# Altium footprint library fszhang.PcbLib: 1032 footprints (part 51 of 66)
Each footprint in its own frame and in the unit in brackets; x right, y up, seen from the top. Pads: shape width x height; smd on the part's side, far side on the other; paste and mask are expansions set on the pad; w line width, h text height; cw(c..) or ccw(c..) is an arc to the next point about the centre after c.
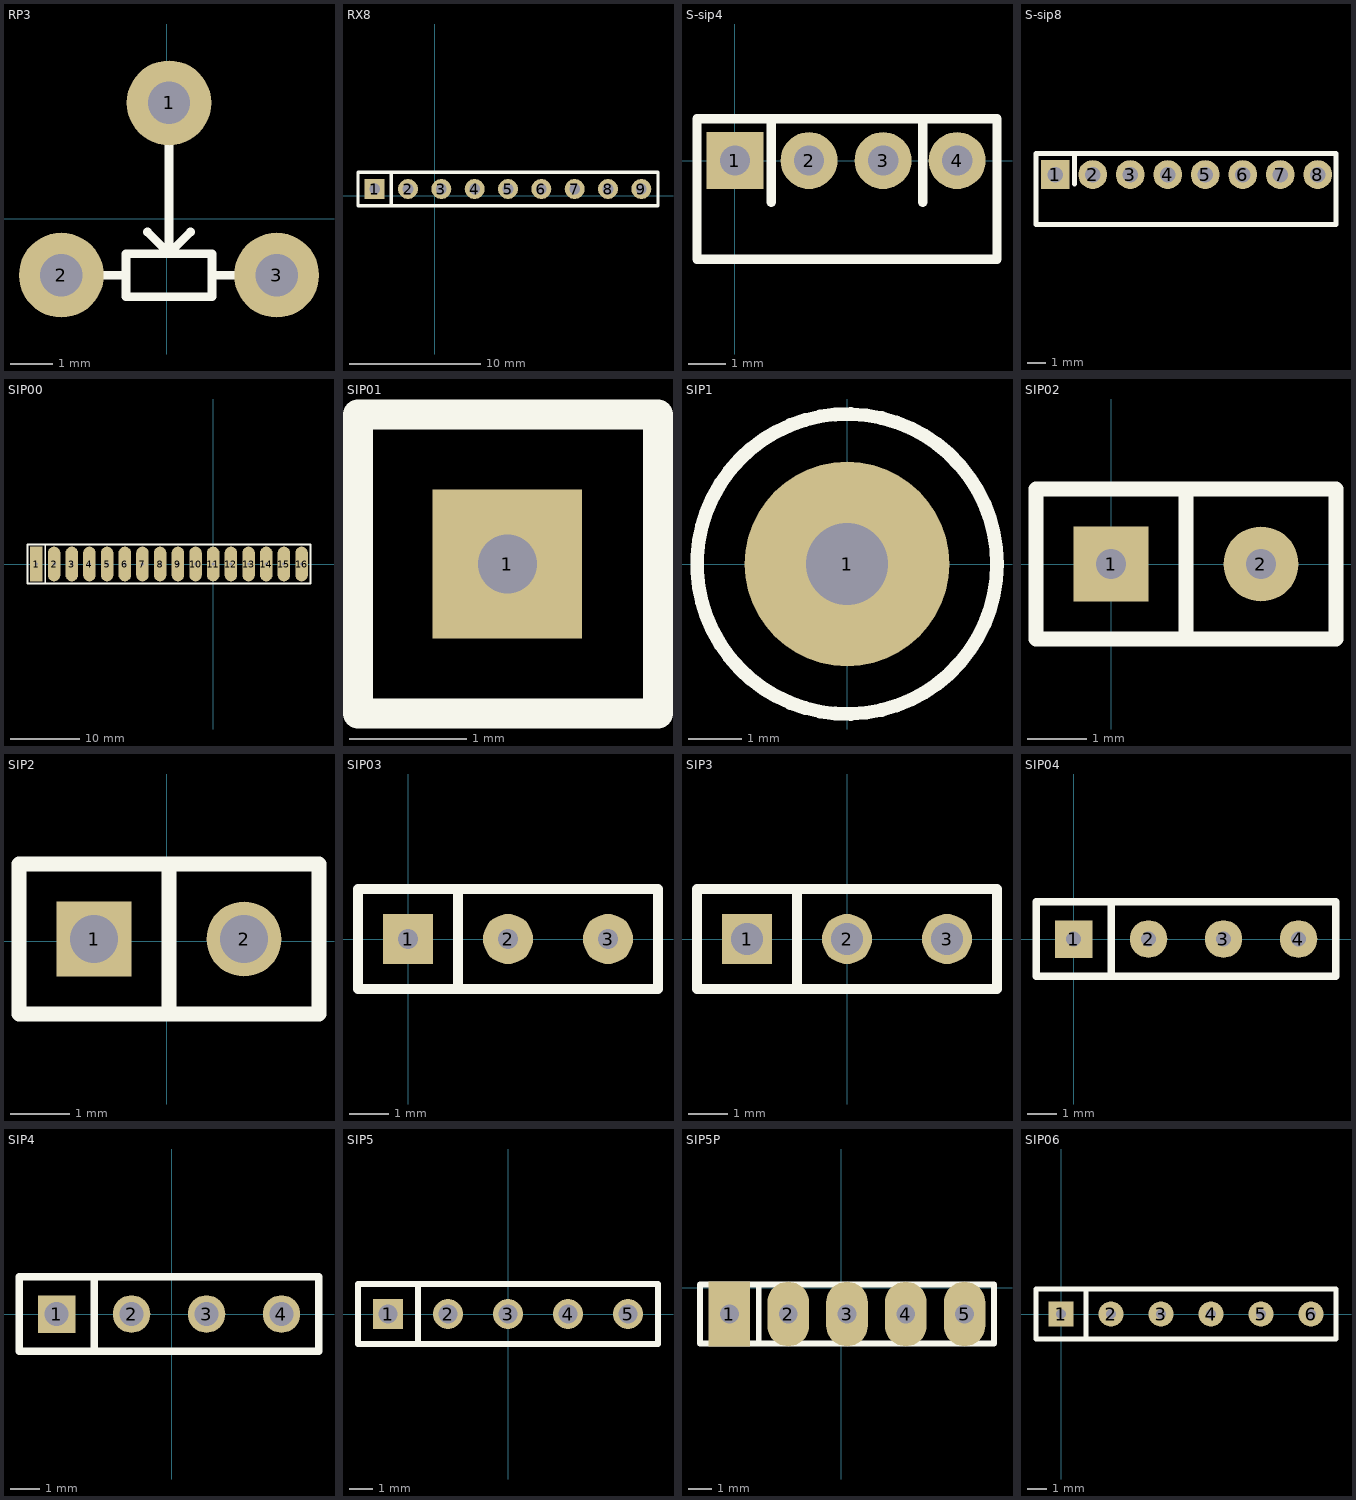
[diagram p50: the footprints below, top view; thin cyan lines are the x and y axes]

## RP3 [mm]
pads (3):
  round 2 hole 1: 1(0.052,2.739) 2(-2.488,-1.325) 3(2.592,-1.325)
Top Overlay:
  lines w0.203: -2.488,-1.325 -0.964,-1.325 ; -0.456,-0.309 0.052,-0.817 ; 0.052,2.739 0.052,-0.817 ; 0.56,-0.309 0.052,-0.817 ; 1.068,-1.325 2.592,-1.325 ; -0.964,-1.325 -0.964,-0.817 1.068,-0.817 1.068,-1.833 -0.964,-1.833 -0.964,-1.325

## RX8 [mil]
pads (9):
  rect 60x60 hole 32: 1(-180,20)
  round 60 hole 32: 2(-80,20) 3(20,20) 4(120,20) 5(220,20) 6(320,20) 7(420,20) 8(520,20) 9(620,20)
Top Overlay:
  lines w10: -130,-30 -130,70 ; -230,-30 670,-30 670,70 -230,70 -230,-30

## S-sip4 [mil]
pads (4):
  rect 60x60 hole 32: 1(0,0)
  round 60 hole 32: 2(78,0) 3(156,0) 4(234,0)
Top Overlay:
  lines w10: 38,-44 38,44 ; 198,-44 198,44 ; -40,-104 -40,44 276,44 276,-104 -40,-104

## S-sip8 [mil]
pads (8):
  rect 60x60 hole 32: 1(48000,2000)
  round 60 hole 32: 2(48078,2000) 3(48156,2000) 4(48234,2000) 5(48312,2000) 6(48390,2000) 7(48468,2000) 8(48546,2000)
Top Overlay:
  lines w10: 48040,1980 48040,2044 ; 47960,1896 47960,2044 48584,2044 48584,1896 47960,1896

## SIP00 [mm]
pads (16):
  rect 1.8x5 hole 0.5: 1(-25.4,0)
  oval 1.8x5 hole 0.5: 2(-22.86,0) 3(-20.32,0) 4(-17.78,0) 5(-15.24,0) 6(-12.7,0) 7(-10.16,0) 8(-7.62,0) 9(-5.08,0) 10(-2.54,0) 11(0,0) 12(2.54,0) 13(5.08,0) 14(7.62,0) 15(10.16,0) 16(12.7,0)
Top Overlay:
  lines w0.254: -24.13,-2.794 -24.13,2.794 ; -26.67,-2.794 13.97,-2.794 13.97,2.794 -26.67,2.794 -26.67,-2.794

## SIP01 [mm]
pads (1):
  rect 1.27x1.27 hole 0.5: 1(50.8,101.6)
Top Overlay:
  lines w0.254: 52.06,100.33 49.53,100.33 49.53,102.87 52.07,102.87 ; 52.08,100.33 52.08,102.87

## SIP1 [mil]
pads (1):
  round 150 hole 60: 1(0,0)
Top Overlay:
  circle w10: c0,0 r110

## SIP02 [mm]
pads (2):
  rect 1.27x1.27 hole 0.5: 1(0,0)
  round 1.27 hole 0.5: 2(2.54,0)
Top Overlay:
  lines w0.254: 1.27,-1.27 1.27,1.27 ; -1.27,-1.27 3.81,-1.27 3.81,1.27 -1.27,1.27 -1.27,-1.27

## SIP2 [mil]
pads (2):
  rect 50x50 hole 32: 1(-48.5,1.42)
  round 50 hole 32: 2(51.5,1.42)
Top Overlay:
  lines w10: 1.5,-48.58 1.5,51.42 ; -98.5,-48.58 -98.5,51.42 101.5,51.42 101.5,-48.58 -98.5,-48.58

## SIP03 [mm]
pads (3):
  rect 1.27x1.27 hole 0.5: 1(0,0)
  round 1.27 hole 0.5: 2(2.54,0) 3(5.08,0)
Top Overlay:
  lines w0.254: 1.27,-1.27 1.27,1.27 ; -1.27,-1.27 6.35,-1.27 6.35,1.27 -1.27,1.27 -1.27,-1.27

## SIP3 [mil]
pads (3):
  rect 50x50 hole 32: 1(-100,0)
  round 50 hole 32: 2(0,0) 3(100,0)
Top Overlay:
  lines w10: -50,-50 -50,50 ; -150,-50 150,-50 150,50 -150,50 -150,-50

## SIP04 [mm]
pads (4):
  rect 1.27x1.27 hole 0.5: 1(0,0)
  round 1.27 hole 0.5: 2(2.54,0) 3(5.08,0) 4(7.62,0)
Top Overlay:
  lines w0.254: 1.27,-1.27 1.27,1.27 ; -1.27,-1.27 -1.27,1.27 8.89,1.27 8.89,-1.27 -1.27,-1.27

## SIP4 [mil]
pads (4):
  rect 50x50 hole 32: 1(-153.62,0)
  round 50 hole 32: 2(-53.62,0) 3(46.38,0) 4(146.38,0)
Top Overlay:
  lines w10: -103.62,-50 -103.62,50 ; -203.62,-50 196.38,-50 196.38,50 -203.62,50 -203.62,-50

## SIP5 [mil]
pads (5):
  rect 50x50 hole 32: 1(-200,0)
  round 50 hole 32: 2(-100,0) 3(0,0) 4(100,0) 5(200,0)
Top Overlay:
  lines w10: -150,-50 -150,50 ; -250,-50 -250,50 250,50 250,-50 -250,-50

## SIP5P [mil]
pads (5):
  rect 70.87x110.24 hole 32: 1(-190,-45)
  oval 70.87x110.24 hole 32: 2(-90,-45) 3(10,-45) 4(110,-45) 5(210,-45)
Top Overlay:
  lines w10: -140,-95 -140,5 ; -240,-95 -240,5 260,5 260,-95 -240,-95

## SIP06 [mm]
pads (6):
  rect 1.27x1.27 hole 0.5: 1(0,0)
  round 1.27 hole 0.5: 2(2.54,0) 3(5.08,0) 4(7.62,0) 5(10.16,0) 6(12.7,0)
Top Overlay:
  lines w0.254: 1.27,-1.27 1.27,1.27 ; -1.27,-1.27 -1.27,1.27 13.97,1.27 13.97,-1.27 -1.27,-1.27